# Altium schematic symbol library SCHLIB.SchLib: 2608 symbols (part 9 of 20)
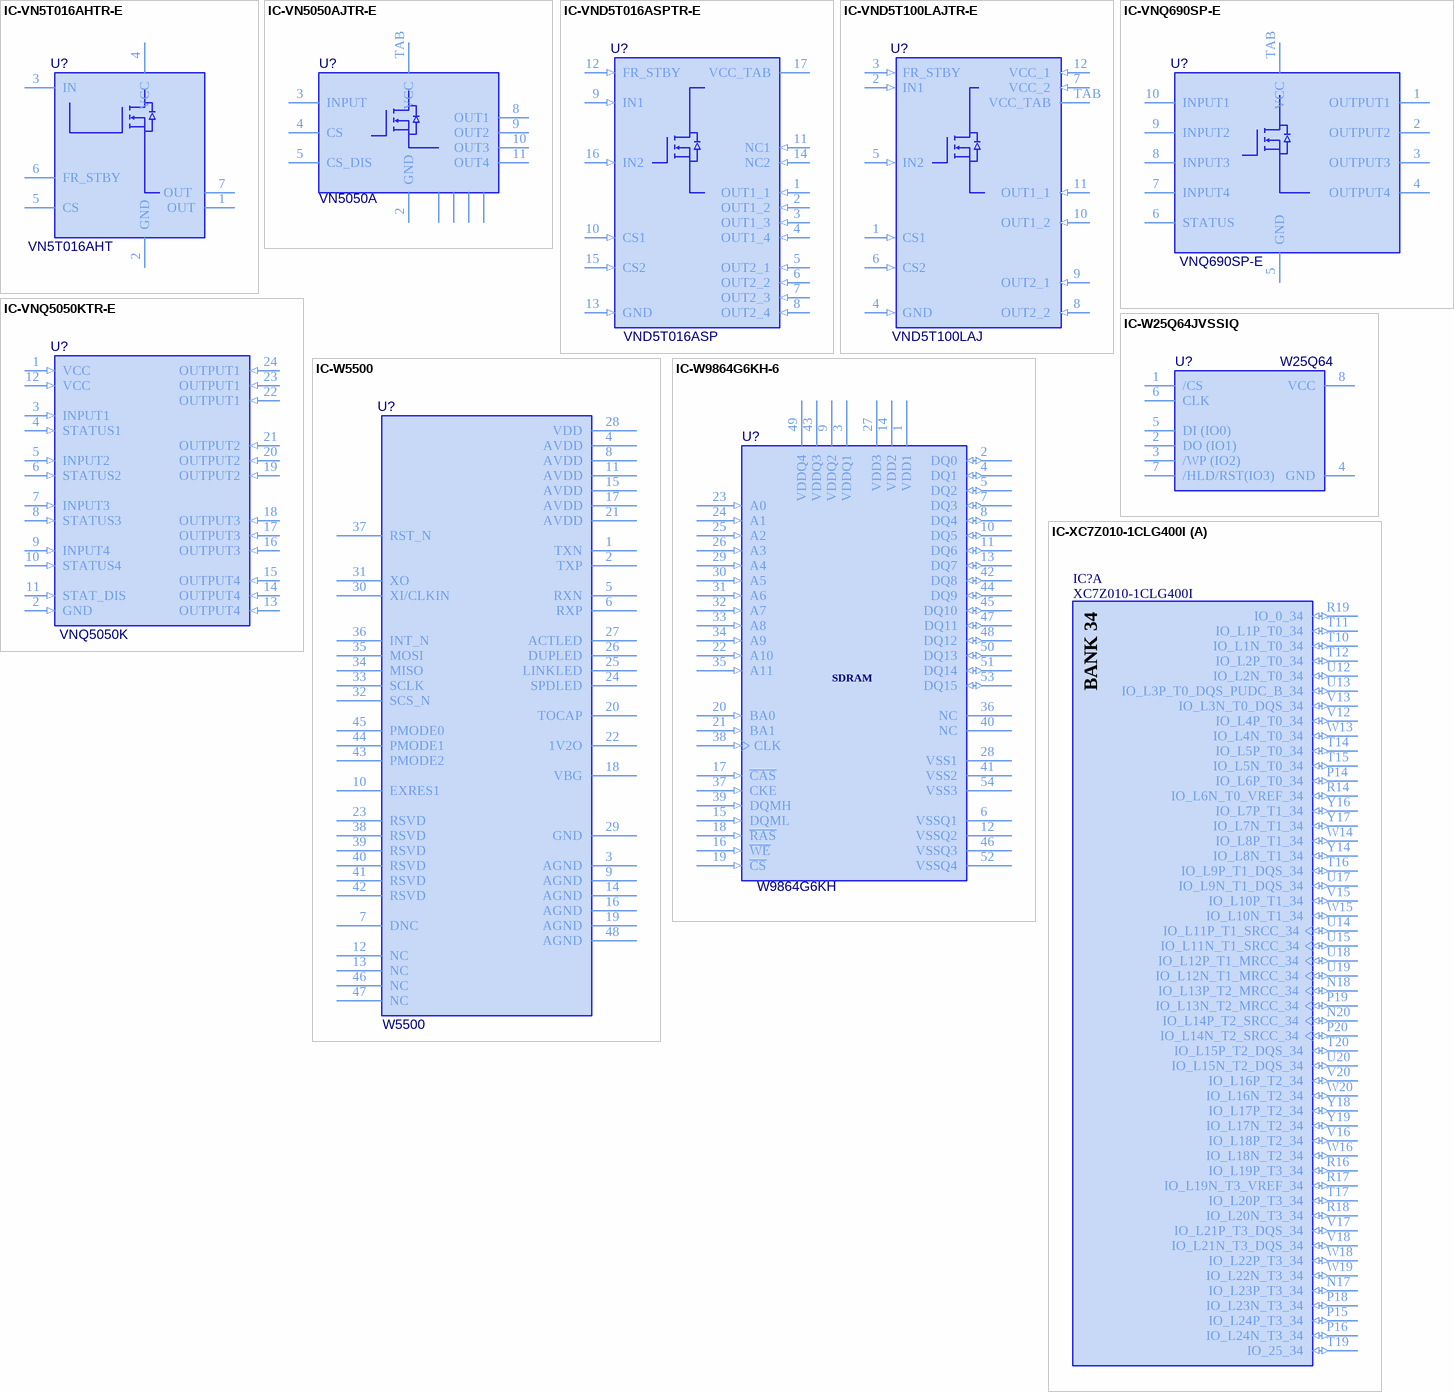
[diagram p91: symbols IC-VN5T016AHTR-E to IC-XC7Z010-1CLG400I]

## IC-VN5050AJTR-E
designator U?, comment VN5050A
IC DVR 1CH HISID AUTO POWERSSO12; Manufacturer: STMicroelectronics; Manufacturer Part Number: VN5050AJTR-E; Max Output Current: 18A; Max Supply Voltage: 36V; Min Supply Voltage: 4.5V; Operating Supply Voltage: 13V; Number of Outputs: 1; Nominal Supply Current: 1.5mA; Turn-Off Delay Time: 40000ns; Turn-On Delay Time: 20000ns; On-State Resistance: 50mR; Output Current per Channel: 12A; Max Supply Current: 3mA; Washability: OK; Supplier 1: Digi-Key; Stock 1: 5770; Pricing 1: 1=2.10000, 10=1.88600, 100=1.51580, 500=1.24534, 1000=1.03186 (USD); RoHS: Yes; Mount: Surface Mount; Number of Pins: 12; Min Operating Temperature: -40°C; Max Operating Temperature: 150°C; Packaging: Tape and Reel; Package Quantity: 2500; Number of Drivers: 1; Radiation Hardening: No; Lead Free: Lead Free; ComponentLink1URL: https://datasheet.ciiva.com/4897/cd00151378-114292-4897872.pdf?src-supplier=Mouser; ComponentLink1Description: https://datasheet.ciiva.com/4897/cd00151378-114292-4897872.pdf?src-supplier=Mouser; ComponentLink2URL: https://datasheet.ciiva.com/41458/001184559-da-01-en-ic-dvr-1ch-vn5050ajtr-e-powersso-12-stm-41458244.pdf?src-supplier=Conrad; ComponentLink2Description: https://datasheet.ciiva.com/41458/001184559-da-01-en-ic-dvr-1ch-vn5050ajtr-e-powersso-12-stm-41458244.pdf?src-supplier=Conrad; ComponentLink3URL: https://datasheet.ciiva.com/1955/cd00151378-1955224.pdf?src-supplier=Digi-Key; ComponentLink3Description: https://datasheet.ciiva.com/1955/cd00151378-1955224.pdf?src-supplier=Digi-Key; ComponentLink4URL: https://datasheet.ciiva.com/1955/cd00151378-1955225.pdf?src-supplier=Digi-Key; ComponentLink4Description: https://datasheet.ciiva.com/1955/cd00151378-1955225.pdf?src-supplier=Digi-Key; ComponentLink5URL: https://datasheet.ciiva.com/1955/cd00151378-1955226.pdf?src-supplier=Digi-Key; ComponentLink5Description: https://datasheet.ciiva.com/1955/cd00151378-1955226.pdf?src-supplier=Digi-Key; ComponentLink6URL: https://datasheet.ciiva.com/26810/getdatasheetpartid-365874-26810746.pdf?src-supplier=Verical; ComponentLink6Description: https://datasheet.ciiva.com/26810/getdatasheetpartid-365874-26810746.pdf?src-supplier=Verical; Supplier Part Number 1: 497-11676-1-ND
footprint PowerSSO-12_M (SOP, 10-Leads, Body 7.5x9.4mm, Pitch 1.27mm, Thermal Pad, IPC Low Density)
pins: 1 NC1, 2 GND, 3 INPUT, 4 CS, 5 CS_DIS, 6 NC2, 7 NC3, 8 OUT1, 9 OUT2, 10 OUT3, 11 OUT4, 12 NC4, TAB VCC

## IC-VND5T016ASPTR-E
designator U?, comment VND5T016ASP
IC PWR DRIVER N-CHAN 1:1 PWRSO16; Manufacturer: STMicroelectronics; Manufacturer Part Number: VND5T016ASPTR-E; Min Supply Voltage: 8V; Number of Outputs: 2; Fault Protection: Over Voltage,Over Temperature; Operating Supply Voltage: 24V; Operating Supply Current: 4.5mA; Turn-Off Delay Time: 45us; Turn-On Delay Time: 50us; Interface: On/Off; Max Supply Current: 6.5mA; Output Configuration: High Side; Max Output Current: 45A; Max Supply Voltage: 36V; Supplier 1: Digi-Key; Supplier Part Number 1: 497-13079-1-ND; Stock: 591; Pricing: 1=5.29, 10=4.748, 25=4.4888, 100=3.6908, 250=3.3117 (USD); RoHS: Yes; Mount: Surface Mount; Number of Pins: 16; Min Operating Temperature: -40°C; Max Operating Temperature: 150°C; Packaging: Tape and Reel; Package Quantity: 600; Number of Drivers: 2; Lead Free: Lead Free; ComponentLink1URL: https://datasheet.ciiva.com/16510/vnd5t016asp-e-16510851.pdf?src-supplier=Future+Electronics; ComponentLink1Description: https://datasheet.ciiva.com/16510/vnd5t016asp-e-16510851.pdf?src-supplier=Future+Electronics; ComponentLink2URL: https://datasheet.ciiva.com/12073/dm00046672-101255-12073525.pdf?src-supplier=Mouser; ComponentLink2Description: https://datasheet.ciiva.com/12073/dm00046672-101255-12073525.pdf?src-supplier=Mouser; ComponentLink3URL: https://datasheet.ciiva.com/41458/001184796-da-01-en-ic-driver-vnd5t016asptr-e-powerso-16-stm-41458154.pdf?src-supplier=Conrad; ComponentLink3Description: https://datasheet.ciiva.com/41458/001184796-da-01-en-ic-driver-vnd5t016asptr-e-powerso-16-stm-41458154.pdf?src-supplier=Conrad; ComponentLink4URL: https://datasheet.ciiva.com/6603/dm00046672-6603110.pdf?src-supplier=Digi-Key; ComponentLink4Description: https://datasheet.ciiva.com/6603/dm00046672-6603110.pdf?src-supplier=Digi-Key; ComponentLink5URL: https://datasheet.ciiva.com/6603/dm00046672-6603111.pdf?src-supplier=Digi-Key; ComponentLink5Description: https://datasheet.ciiva.com/6603/dm00046672-6603111.pdf?src-supplier=Digi-Key; ComponentLink6URL: https://datasheet.ciiva.com/6603/dm00046672-6603112.pdf?src-supplier=Digi-Key; ComponentLink6Description: https://datasheet.ciiva.com/6603/dm00046672-6603112.pdf?src-supplier=Digi-Key
footprint POWERSO16 (SOP, 16-Leads, Body 7.50x9.45mm, Pitch 0.80mm, Thermal Pad 9.60x7.50mm, IPC Medium Density)
pins: 1 OUT1_1 (in), 2 OUT1_2 (in), 3 OUT1_3 (in), 4 OUT1_4 (in), 5 OUT2_1 (in), 6 OUT2_2 (in), 7 OUT2_3 (in), 8 OUT2_4 (in), 9 IN1 (in), 10 CS1 (in), 11 NC1 (in), 12 FR_STBY (in), 13 GND (in), 14 NC2 (in), 15 CS2 (in), 16 IN2 (in), 17 VCC_TAB

## IC-VND5T100LAJTR-E
designator U?, comment VND5T100LAJ
IC PWR DRVR N-CHAN 1:1 PWRSSO12; Manufacturer: STMicroelectronics; Manufacturer Part Number: VND5T100LAJTR-E; Fault Protection: Over Temperature; Number of Outputs: 2; Max Supply Voltage: 36V; Min Supply Voltage: 8V; Interface: On/Off; Max Output Current: 16A; Turn-On Delay Time: 27000ns; Turn-Off Delay Time: 38000ns; Max Supply Current: 6mA; Output Configuration: High Side; Supplier 1: Digi-Key; Supplier Part Number 1: 497-14314-1-ND; Stock: 4669; Pricing: 1=2.65, 10=2.38, 25=2.25, 100=1.85, 250=1.66, 500=1.6, 1000=1.33 (USD); RoHS: Yes; Mount: Surface Mount; Number of Pins: 12; Min Operating Temperature: -40°C; Max Operating Temperature: 150°C; Packaging: Tape and Reel; Package Quantity: 2500; Number of Drivers: 2; Radiation Hardening: No; ComponentLink1URL: https://datasheet.ciiva.com/29600/dm00058385-29600064.pdf?src-supplier=Digi-Key; ComponentLink1Description: https://datasheet.ciiva.com/29600/dm00058385-29600064.pdf?src-supplier=Digi-Key
footprint PowerSSO-12_M (SOP, 10-Leads, Body 7.5x9.4mm, Pitch 1.27mm, Thermal Pad, IPC Low Density)
pins: 1 CS1 (in), 2 IN1 (in), 3 FR_STBY (in), 4 GND (in), 5 IN2 (in), 6 CS2 (in), 7 VCC_2 (in), 8 OUT2_2 (in), 9 OUT2_1 (in), 10 OUT1_2 (in), 11 OUT1_1 (in), 12 VCC_1 (in), TAB VCC_TAB

## IC-VNQ690SP-E
designator U?, comment VNQ690SP-E
IC DVR QUAD HIGH SIDE POWERSO10; Manufacturer: STMicroelectronics; Max Output Current: 10A; On-State Resistance: 90mR; Output Current per Channel: 6A; Max Supply Current: 6mA; Power Dissipation: 78W; Number of Outputs: 4; Max Input Voltage: 36V; Min Input Voltage: 5.5V; Supplier 1: Digi-Key; Supplier Part Number 1: 497-19257-ND; Manufacturer Part Number: VNQ690SP-E; Stock: 377; Pricing: 1=4.28, 10=3.846, 25=3.636, 100=2.9896, 250=2.6826, 500=2.5856, 1000=2.1493, 2500=2.0685, 5000=2.0038 (USD); RoHS: Yes; Mount: Surface Mount; Number of Pins: 10; Min Operating Temperature: -40°C; Max Operating Temperature: 150°C; Output Current: 10A; Nominal Supply Current: 6mA; Packaging: Rail/Tube; Package Quantity: 50; Max Power Dissipation: 78W; Operating Supply Voltage: 36V; Radiation Hardening: No; ComponentLink1URL: https://datasheet.ciiva.com/1957/cd00044338-1957014.pdf?src-supplier=Digi-Key; ComponentLink1Description: https://datasheet.ciiva.com/1957/cd00044338-1957014.pdf?src-supplier=Digi-Key; ComponentLink2URL: https://datasheet.ciiva.com/12186/cd00044338-470173-12186541.pdf?src-supplier=Mouser; ComponentLink2Description: https://datasheet.ciiva.com/12186/cd00044338-470173-12186541.pdf?src-supplier=Mouser
pins: 1 OUTPUT1, 2 OUTPUT2, 3 OUTPUT3, 4 OUTPUT4, 5 GND, 6 STATUS, 7 INPUT4, 8 INPUT3, 9 INPUT2, 10 INPUT1, TAB VCC

## IC-VNQ5050KTR-E
designator U?, comment VNQ5050K
IC DRIVER HISIDE QUAD POWERSSO24; Manufacturer: STMicroelectronics; Manufacturer Part Number: VNQ5050KTR-E; Interface: On/Off; Number of Drivers: 4; Turn-Off Delay Time: 40000ns; Turn-On Delay Time: 15000ns; Max Supply Current: 14mA; Output Configuration: High Side; Max Output Current: 12A; Max Supply Voltage: 36V; Min Supply Voltage: 4.5V; Operating Supply Voltage: 13V; Fault Protection: Over Voltage,Over Temperature; Supplier 1: Digi-Key; Supplier Part Number 1: 497-11716-1-ND; Stock: 15624; Pricing: 1=4.5, 10=4.042, 25=3.8216, 100=3.1422, 250=2.8195, 500=2.7176 (USD); RoHS: Yes; Mount: Surface Mount; Number of Pins: 24; Min Operating Temperature: -40°C; Max Operating Temperature: 150°C; Packaging: Tape and Reel; Number of Outputs: 4; Output Current: 12A; Nominal Supply Current: 14mA; Package Quantity: 1000; Radiation Hardening: No; Lead Free: Lead Free; ComponentLink1URL: https://datasheet.ciiva.com/15109/getdatasheetpartid-98655-15109902.pdf?src-supplier=Verical; ComponentLink1Description: https://datasheet.ciiva.com/15109/getdatasheetpartid-98655-15109902.pdf?src-supplier=Verical; ComponentLink2URL: https://datasheet.ciiva.com/1955/cd00044249-1955296.pdf?src-supplier=Digi-Key; ComponentLink2Description: https://datasheet.ciiva.com/1955/cd00044249-1955296.pdf?src-supplier=Digi-Key; ComponentLink3URL: https://datasheet.ciiva.com/1955/cd00044249-1955297.pdf?src-supplier=Digi-Key; ComponentLink3Description: https://datasheet.ciiva.com/1955/cd00044249-1955297.pdf?src-supplier=Digi-Key; ComponentLink4URL: https://datasheet.ciiva.com/1955/cd00044249-1955298.pdf?src-supplier=Digi-Key; ComponentLink4Description: https://datasheet.ciiva.com/1955/cd00044249-1955298.pdf?src-supplier=Digi-Key; ComponentLink5URL: https://datasheet.ciiva.com/48511/cd00044249-48511581.pdf?src-supplier=Avnet; ComponentLink5Description: https://datasheet.ciiva.com/48511/cd00044249-48511581.pdf?src-supplier=Avnet; ComponentLink6URL: https://datasheet.ciiva.com/17236/cd00044249-17236447.pdf?src-supplier=Avnet+Europe; ComponentLink6Description: https://datasheet.ciiva.com/17236/cd00044249-17236447.pdf?src-supplier=Avnet+Europe
footprint POWERSSO24 (SOP, 24-Leads, Body 10.30x7.50mm, Pitch 0.80mm, Thermal Pad 7.10x4.70mm, IPC Medium Density)
pins: 1 VCC (in), 2 GND (in), 3 INPUT1 (in), 4 STATUS1 (in), 5 INPUT2 (in), 6 STATUS2 (in), 7 INPUT3 (in), 8 STATUS3 (in), 9 INPUT4 (in), 10 STATUS4 (in), 11 STAT_DIS (in), 12 VCC (in), 13 OUTPUT4 (in), 14 OUTPUT4 (in), 15 OUTPUT4 (in), 16 OUTPUT3 (in), 17 OUTPUT3 (in), 18 OUTPUT3 (in), 19 OUTPUT2 (in), 20 OUTPUT2 (in), 21 OUTPUT2 (in), 22 OUTPUT1 (in), 23 OUTPUT1 (in), 24 OUTPUT1 (in)

## IC-W25Q64JVSSIQ
designator U?, comment W25Q64
IC FLASH 64M SPI 133MHZ 8SOIC; Manufacturer: Winbond; Manufacturer Part Number: W25Q64JVSSIQ; Frequency: 104MHz; Max Supply Voltage: 3.6V; Min Supply Voltage: 2.7V; Page Size: 256B; Density: 64MB; Operating Supply Voltage: 3V; Address Bus Width: 24b; Access Time: 6ns; Washability: OK; Supplier 1: Digi-Key; Stock 1: 94868; Pricing 1: 1=0.93000, 10=0.84500, 25=0.83400, 90=0.82933, 180=0.74156, 270=0.73515, 540=0.72443, 1080=0.69830, 5040=0.63617 (USD); RoHS: Yes; Mount: Surface Mount; Case/Package: SOIC; Number of Pins: 8; Min Operating Temperature: -40°C; Max Operating Temperature: 85°C; Packaging: Tray; Memory Type: FLASH; Interface: SPI; ComponentLink1URL: http://www.winbond.com/resource-files/w25q64jv%20revj%2003272018%20plus.pdf?src-supplier=Digi-Key; ComponentLink1Description: http://www.winbond.com/resource-files/w25q64jv%20revj%2003272018%20plus.pdf?src-supplier=Digi-Key; ComponentLink2URL: https://www.winbond.com/resource-files/w25q64jv%20spi%20%20%20revc%2006032016%20kms.pdf?src-supplier=Avnet+Asia; ComponentLink2Description: https://www.winbond.com/resource-files/w25q64jv%20spi%20%20%20revc%2006032016%20kms.pdf?src-supplier=Avnet+Asia; Supplier Part Number 1: W25Q64JVSSIQ-ND
footprint SOIC8-IPC (SOIC, 8-Leads, Body 5.28x5.28mm, Pitch 1.27mm, IPC Medium Density)
pins: 1 /CS, 2 DO (IO1), 3 /WP (IO2), 4 GND, 5 DI (IO0), 6 CLK, 7 /HLD/RST(IO3), 8 VCC

## IC-W5500
designator U?, comment W5500
IC CTLR 3-1 ETH TCP/IP 48LQFP; Manufacturer: WIZnet; Max Supply Current: 132mA; Max Supply Voltage: 3.63V; Min Supply Voltage: 2.97V; Interface: SPI; Number of Transceivers: 1; Washability: OK; Supplier 1: Digi-Key; Supplier Part Number 1: 1278-1021-ND; Manufacturer Part Number: W5500; Stock 1: 17704; Pricing 1: 1=3.95000, 10=3.54600, 25=3.35240, 100=2.75650, 250=2.47340, 500=2.38400, 1000=1.98170, 2500=1.90720, 5000=1.84760 (USD); RoHS: Yes; Case/Package: LQFP; Number of Pins: 48; Min Operating Temperature: -40°C; Max Operating Temperature: 85°C; Packaging: Tray; Package Quantity: 250; Operating Supply Current: 132mA; Lead Free: Lead Free; ComponentLink1URL: https://datasheet.ciiva.com/29644/w5500-ds-v100e-29644866.pdf?src-supplier=Digi-Key; ComponentLink1Description: https://datasheet.ciiva.com/29644/w5500-ds-v100e-29644866.pdf?src-supplier=Digi-Key; ComponentLink2URL: https://datasheet.ciiva.com/24199/w5500-24199988.pdf?src-supplier=Future+Electronics; ComponentLink2Description: https://datasheet.ciiva.com/24199/w5500-24199988.pdf?src-supplier=Future+Electronics
footprint STM-LQFP48_M (QFP, 48-Leads, Body 7x7mm, Pitch 0.5mm, IPC Low Density)
pins: 1 TXN, 2 TXP, 3 AGND, 4 AVDD, 5 RXN, 6 RXP, 7 DNC, 8 AVDD, 9 AGND, 10 EXRES1, 11 AVDD, 12 NC, 13 NC, 14 AGND, 15 AVDD, 16 AGND, 17 AVDD, 18 VBG, 19 AGND, 20 TOCAP, 21 AVDD, 22 1V2O, 23 RSVD, 24 SPDLED, 25 LINKLED, 26 DUPLED, 27 ACTLED, 28 VDD, 29 GND, 30 XI/CLKIN, 31 XO, 32 SCS_N, 33 SCLK, 34 MISO, 35 MOSI, 36 INT_N, 37 RST_N, 38 RSVD, 39 RSVD, 40 RSVD, 41 RSVD, 42 RSVD, 43 PMODE2, 44 PMODE1, 45 PMODE0, 46 NC, 47 NC, 48 AGND

## IC-W9864G6KH-6
designator U?, comment W9864G6KH
IC SDRAM 64MBIT 166MHZ 54TSOP; Manufacturer: Winbond; Manufacturer Part Number: W9864G6KH-6; Interface: Parallel; Memory Type: RAM; Washability: OK; Supplier 1: Digi-Key; Stock 1: 1100; Pricing 1: 1=1.21000, 10=1.10500, 25=1.07560, 50=1.07000, 108=0.95648, 324=0.95361, 540=0.93943, 1080=0.89913, 5076=0.83725 (USD); RoHS: Yes; Case/Package: TSOP; Min Operating Temperature: 0°C; Max Operating Temperature: 70°C; Packaging: Tray; Frequency: 166MHz; ComponentLink1URL: http://www.winbond.com/resource-files/w9864g6kh_a02.pdf?src-supplier=Digi-Key; ComponentLink1Description: http://www.winbond.com/resource-files/w9864g6kh_a02.pdf?src-supplier=Digi-Key; Supplier Part Number 1: W9864G6KH-6-ND
footprint TSOP-54 II (TSOP, 54-Leads, Body 22.22x10.16mm, Pitch 0.80mm, IPC Medium Density)
pins: 1 VDD1 (power), 2 DQ0 (io), 3 VDDQ1 (power), 4 DQ1 (io), 5 DQ2 (io), 6 VSSQ1 (power), 7 DQ3 (io), 8 DQ4 (io), 9 VDDQ2 (power), 10 DQ5 (io), 11 DQ6 (io), 12 VSSQ2 (power), 13 DQ7 (io), 14 VDD2 (power), 15 DQML (in), 16 ~{WE} (in), 17 ~{CAS} (in), 18 ~{RAS} (in), 19 ~{CS} (in), 20 BA0 (in), 21 BA1 (in), 22 A10 (in), 23 A0 (in), 24 A1 (in), 25 A2 (in), 26 A3 (in), 27 VDD3 (power), 28 VSS1 (power), 29 A4 (in), 30 A5 (in), 31 A6 (in), 32 A7 (in), 33 A8 (in), 34 A9 (in), 35 A11 (in), 36 NC, 37 CKE (in), 38 CLK (in), 39 DQMH (in), 40 NC, 41 VSS2 (power), 42 DQ8 (io), 43 VDDQ3 (power), 44 DQ9 (io), 45 DQ10 (io), 46 VSSQ3 (power), 47 DQ11 (io), 48 DQ12 (io), 49 VDDQ4 (power), 50 DQ13 (io), 51 DQ14 (io), 52 VSSQ4 (power), 53 DQ15 (io), 54 VSS3 (power)
text: SDRAM

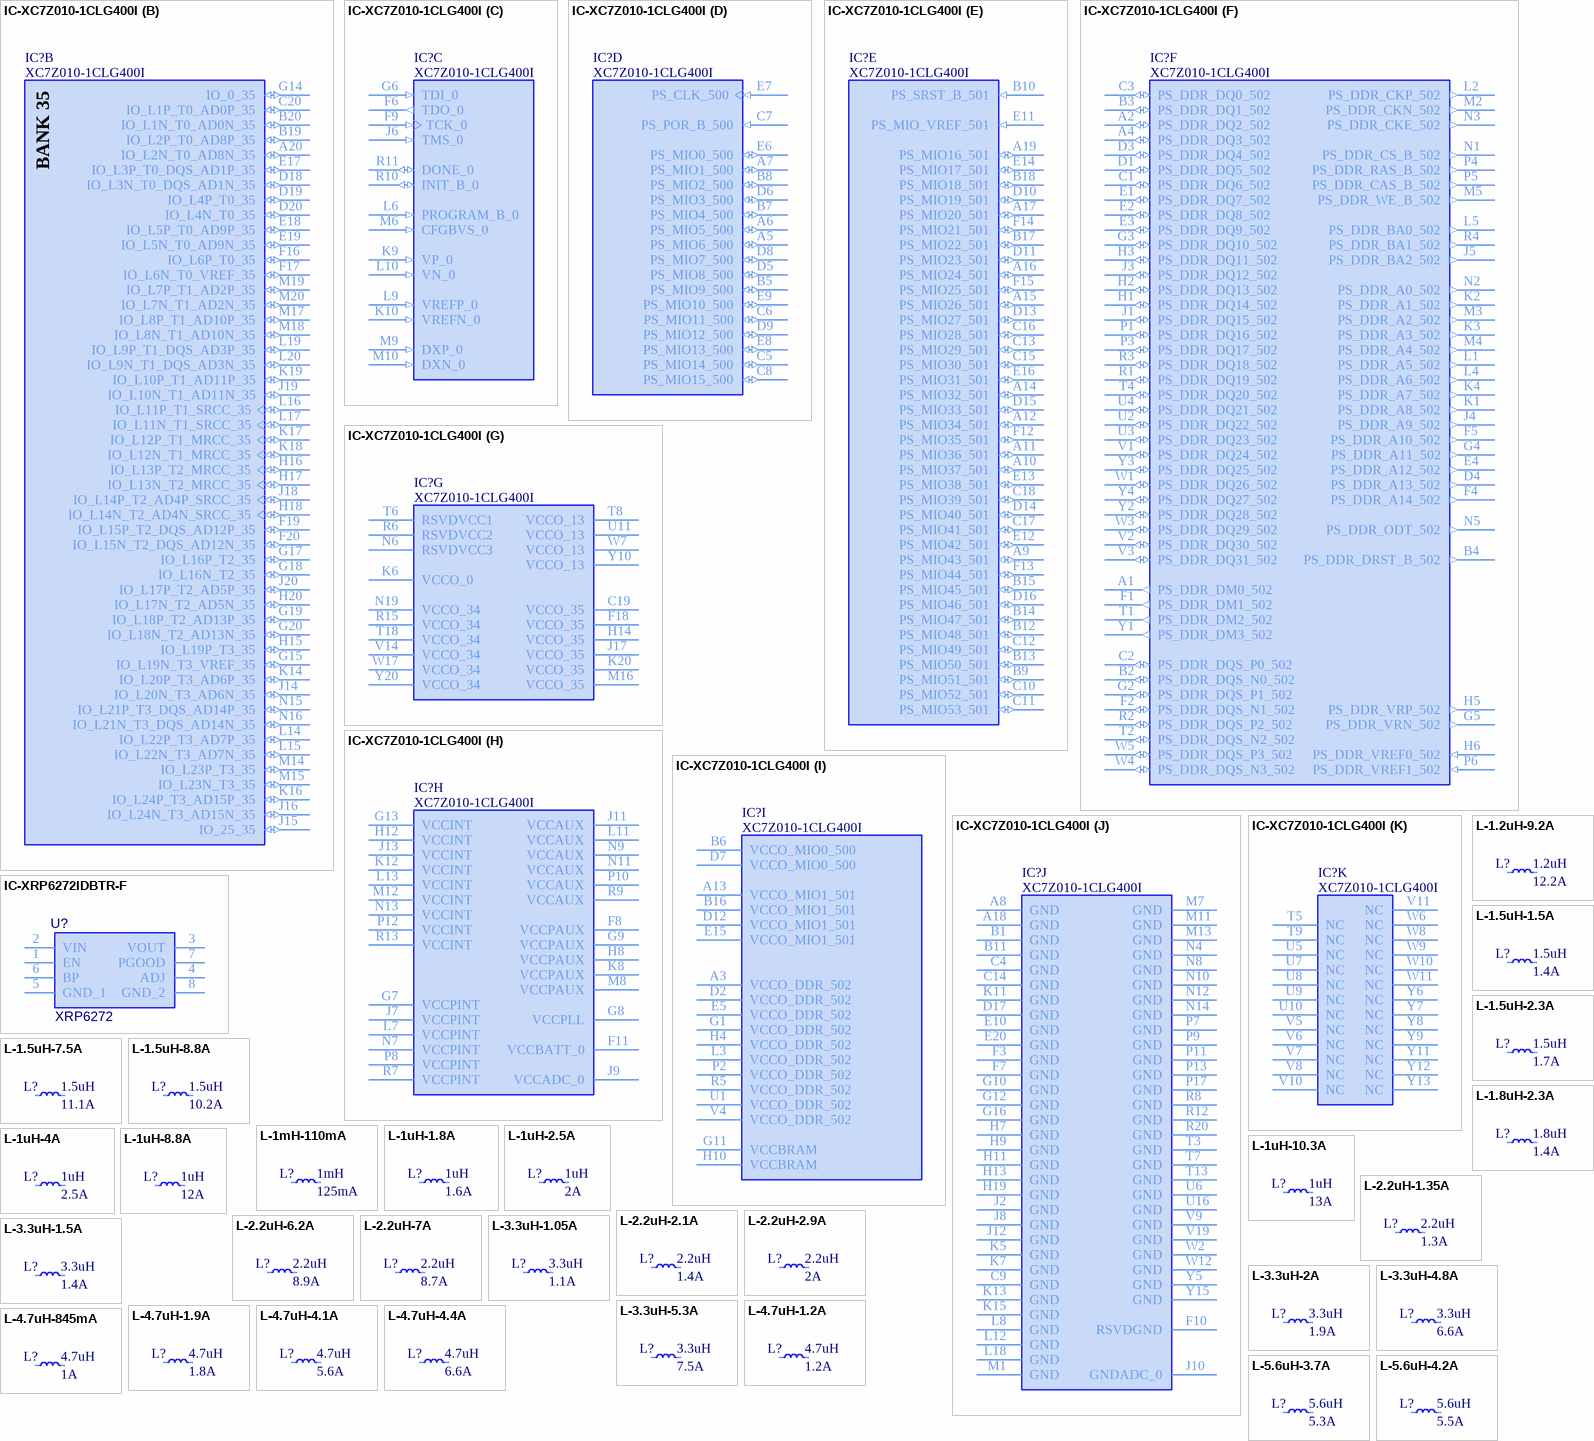
[diagram p38: symbols IC-XC7Z010-1CLG400I to L-5.6uH-4.2A]

## IC-XC7Z010-1CLG400I
designator IC?, comment XC7Z010-1CLG400I
667 MHz Zynq™-7000 AP SoC, 130 PS I/O, 100 FPGA I/O, 400-Ball BGA, Speed Grade 1, Industrial Grade, Pb-Free; Manufacturer: XILINX; PressFit: No; Bonding: No; Component Kind: Standard; Component Type: Standard; Device: XC7Z010-1CLG400I; Footprint: BGA400C80P20X20_1700X1700X160; PackageDescription: BGA, 0.80mm Pitch, Square; 400 Pin, 20 Columns X 20 Rows, Body 17.00mm X 17.00mm X 1.60mm H, IPC Medium Density; Part Description: 667 MHz Zynq™-7000 AP SoC, 130 PS I/O, 100 FPGA I/O, 400-Ball BGA, Speed Grade 1, Industrial Grade, Pb-Free; Manufacturer Part Number: XC7Z010-1CLG400I; Pin Count: 400; Case: BGA400; Mounted: Yes; Socket: No; SMD: Yes; Sense: No; ComponentHeight: 1.6mm; ComponentLink1URL: \\cern.ch\dfs\Applications\Altium\Datasheets\XC7Z010-1CLG400I_Package-Pinout.pdf; ComponentLink1Description: Package/Pinout
footprint BGA400C80P20X20_1700X1700X160
part A pins: N17 IO_L23P_T3_34 (io), N18 IO_L13P_T2_MRCC_34 (io), N20 IO_L14P_T2_SRCC_34 (io), P14 IO_L6P_T0_34 (io), P15 IO_L24P_T3_34 (io), P16 IO_L24N_T3_34 (io), P18 IO_L23N_T3_34 (io), P19 IO_L13N_T2_MRCC_34 (io), P20 IO_L14N_T2_SRCC_34 (io), R14 IO_L6N_T0_VREF_34 (io), R16 IO_L19P_T3_34 (io), R17 IO_L19N_T3_VREF_34 (io), R18 IO_L20N_T3_34 (io), R19 IO_0_34 (io), T10 IO_L1N_T0_34 (io), T11 IO_L1P_T0_34 (io), T12 IO_L2P_T0_34 (io), T14 IO_L5P_T0_34 (io), T15 IO_L5N_T0_34 (io), T16 IO_L9P_T1_DQS_34 (io), T17 IO_L20P_T3_34 (io), T19 IO_25_34 (io), T20 IO_L15P_T2_DQS_34 (io), U12 IO_L2N_T0_34 (io), U13 IO_L3P_T0_DQS_PUDC_B_34 (io), U14 IO_L11P_T1_SRCC_34 (io), U15 IO_L11N_T1_SRCC_34 (io), U17 IO_L9N_T1_DQS_34 (io), U18 IO_L12P_T1_MRCC_34 (io), U19 IO_L12N_T1_MRCC_34 (io), U20 IO_L15N_T2_DQS_34 (io), V12 IO_L4P_T0_34 (io), V13 IO_L3N_T0_DQS_34 (io), V15 IO_L10P_T1_34 (io), V16 IO_L18P_T2_34 (io), V17 IO_L21P_T3_DQS_34 (io), V18 IO_L21N_T3_DQS_34 (io), V20 IO_L16P_T2_34 (io), W13 IO_L4N_T0_34 (io), W14 IO_L8P_T1_34 (io), W15 IO_L10N_T1_34 (io), W16 IO_L18N_T2_34 (io), W18 IO_L22P_T3_34 (io), W19 IO_L22N_T3_34 (io), W20 IO_L16N_T2_34 (io), Y14 IO_L8N_T1_34 (io), Y16 IO_L7P_T1_34 (io), Y17 IO_L7N_T1_34 (io), Y18 IO_L17P_T2_34 (io), Y19 IO_L17N_T2_34 (io)
part B pins: A20 IO_L2N_T0_AD8N_35 (io), B19 IO_L2P_T0_AD8P_35 (io), B20 IO_L1N_T0_AD0N_35 (io), C20 IO_L1P_T0_AD0P_35 (io), D18 IO_L3N_T0_DQS_AD1N_35 (io), D19 IO_L4P_T0_35 (io), D20 IO_L4N_T0_35 (io), E17 IO_L3P_T0_DQS_AD1P_35 (io), E18 IO_L5P_T0_AD9P_35 (io), E19 IO_L5N_T0_AD9N_35 (io), F16 IO_L6P_T0_35 (io), F17 IO_L6N_T0_VREF_35 (io), F19 IO_L15P_T2_DQS_AD12P_35 (io), F20 IO_L15N_T2_DQS_AD12N_35 (io), G14 IO_0_35 (io), G15 IO_L19N_T3_VREF_35 (io), G17 IO_L16P_T2_35 (io), G18 IO_L16N_T2_35 (io), G19 IO_L18P_T2_AD13P_35 (io), G20 IO_L18N_T2_AD13N_35 (io), H15 IO_L19P_T3_35 (io), H16 IO_L13P_T2_MRCC_35 (io), H17 IO_L13N_T2_MRCC_35 (io), H18 IO_L14N_T2_AD4N_SRCC_35 (io), H20 IO_L17N_T2_AD5N_35 (io), J14 IO_L20N_T3_AD6N_35 (io), J15 IO_25_35 (io), J16 IO_L24N_T3_AD15N_35 (io), J18 IO_L14P_T2_AD4P_SRCC_35 (io), J19 IO_L10N_T1_AD11N_35 (io), J20 IO_L17P_T2_AD5P_35 (io), K14 IO_L20P_T3_AD6P_35 (io), K16 IO_L24P_T3_AD15P_35 (io), K17 IO_L12P_T1_MRCC_35 (io), K18 IO_L12N_T1_MRCC_35 (io), K19 IO_L10P_T1_AD11P_35 (io), L14 IO_L22P_T3_AD7P_35 (io), L15 IO_L22N_T3_AD7N_35 (io), L16 IO_L11P_T1_SRCC_35 (io), L17 IO_L11N_T1_SRCC_35 (io), L19 IO_L9P_T1_DQS_AD3P_35 (io), L20 IO_L9N_T1_DQS_AD3N_35 (io), M14 IO_L23P_T3_35 (io), M15 IO_L23N_T3_35 (io), M17 IO_L8P_T1_AD10P_35 (io), M18 IO_L8N_T1_AD10N_35 (io), M19 IO_L7P_T1_AD2P_35 (io), M20 IO_L7N_T1_AD2N_35 (io), N15 IO_L21P_T3_DQS_AD14P_35 (io), N16 IO_L21N_T3_DQS_AD14N_35 (io)
part C pins: F6 TDO_0 (out), F9 TCK_0 (in), G6 TDI_0 (in), J6 TMS_0 (in), K9 VP_0 (in), K10 VREFN_0 (in), L6 PROGRAM_B_0 (in), L9 VREFP_0 (in), L10 VN_0 (in), M6 CFGBVS_0 (in), M9 DXP_0 (in), M10 DXN_0 (in), R10 INIT_B_0 (io), R11 DONE_0 (io)
part D pins: A5 PS_MIO6_500 (io), A6 PS_MIO5_500 (io), A7 PS_MIO1_500 (io), B5 PS_MIO9_500 (io), B7 PS_MIO4_500 (io), B8 PS_MIO2_500 (io), C5 PS_MIO14_500 (io), C6 PS_MIO11_500 (io), C7 PS_POR_B_500 (in), C8 PS_MIO15_500 (io), D5 PS_MIO8_500 (io), D6 PS_MIO3_500 (io), D8 PS_MIO7_500 (io), D9 PS_MIO12_500 (io), E6 PS_MIO0_500 (io), E7 PS_CLK_500 (in), E8 PS_MIO13_500 (io), E9 PS_MIO10_500 (io)
part E pins: A9 PS_MIO43_501 (io), A10 PS_MIO37_501 (io), A11 PS_MIO36_501 (io), A12 PS_MIO34_501 (io), A14 PS_MIO32_501 (io), A15 PS_MIO26_501 (io), A16 PS_MIO24_501 (io), A17 PS_MIO20_501 (io), A19 PS_MIO16_501 (io), B9 PS_MIO51_501 (io), B10 PS_SRST_B_501 (in), B12 PS_MIO48_501 (io), B13 PS_MIO50_501 (io), B14 PS_MIO47_501 (io), B15 PS_MIO45_501 (io), B17 PS_MIO22_501 (io), B18 PS_MIO18_501 (io), C10 PS_MIO52_501 (io), C11 PS_MIO53_501 (io), C12 PS_MIO49_501 (io), C13 PS_MIO29_501 (io), C15 PS_MIO30_501 (io), C16 PS_MIO28_501 (io), C17 PS_MIO41_501 (io), C18 PS_MIO39_501 (io), D10 PS_MIO19_501 (io), D11 PS_MIO23_501 (io), D13 PS_MIO27_501 (io), D14 PS_MIO40_501 (io), D15 PS_MIO33_501 (io), D16 PS_MIO46_501 (io), E11 PS_MIO_VREF_501 (in), E12 PS_MIO42_501 (io), E13 PS_MIO38_501 (io), E14 PS_MIO17_501 (io), E16 PS_MIO31_501 (io), F12 PS_MIO35_501 (io), F13 PS_MIO44_501 (io), F14 PS_MIO21_501 (io), F15 PS_MIO25_501 (io)
part F pins: A1 PS_DDR_DM0_502 (out), A2 PS_DDR_DQ2_502 (io), A4 PS_DDR_DQ3_502 (io), B2 PS_DDR_DQS_N0_502 (io), B3 PS_DDR_DQ1_502 (io), B4 PS_DDR_DRST_B_502 (out), C1 PS_DDR_DQ6_502 (io), C2 PS_DDR_DQS_P0_502 (io), C3 PS_DDR_DQ0_502 (io), D1 PS_DDR_DQ5_502 (io), D3 PS_DDR_DQ4_502 (io), D4 PS_DDR_A13_502 (out), E1 PS_DDR_DQ7_502 (io), E2 PS_DDR_DQ8_502 (io), E3 PS_DDR_DQ9_502 (io), E4 PS_DDR_A12_502 (out), F1 PS_DDR_DM1_502 (out), F2 PS_DDR_DQS_N1_502 (io), F4 PS_DDR_A14_502 (out), F5 PS_DDR_A10_502 (out), G2 PS_DDR_DQS_P1_502 (io), G3 PS_DDR_DQ10_502 (io), G4 PS_DDR_A11_502 (out), G5 PS_DDR_VRN_502 (out), H1 PS_DDR_DQ14_502 (io), H2 PS_DDR_DQ13_502 (io), H3 PS_DDR_DQ11_502 (io), H5 PS_DDR_VRP_502 (out), H6 PS_DDR_VREF0_502 (in), J1 PS_DDR_DQ15_502 (io), J3 PS_DDR_DQ12_502 (io), J4 PS_DDR_A9_502 (out), J5 PS_DDR_BA2_502 (out), K1 PS_DDR_A8_502 (out), K2 PS_DDR_A1_502 (out), K3 PS_DDR_A3_502 (out), K4 PS_DDR_A7_502 (out), L1 PS_DDR_A5_502 (out), L2 PS_DDR_CKP_502 (out), L4 PS_DDR_A6_502 (out), L5 PS_DDR_BA0_502 (out), M2 PS_DDR_CKN_502 (out), M3 PS_DDR_A2_502 (out), M4 PS_DDR_A4_502 (out), M5 PS_DDR_WE_B_502 (out), N1 PS_DDR_CS_B_502 (out), N2 PS_DDR_A0_502 (out), N3 PS_DDR_CKE_502 (out), N5 PS_DDR_ODT_502 (out), P1 PS_DDR_DQ16_502 (io), P3 PS_DDR_DQ17_502 (io), P4 PS_DDR_RAS_B_502 (out), P5 PS_DDR_CAS_B_502 (out), P6 PS_DDR_VREF1_502 (in), R1 PS_DDR_DQ19_502 (io), R2 PS_DDR_DQS_P2_502 (io), R3 PS_DDR_DQ18_502 (io), R4 PS_DDR_BA1_502 (out), T1 PS_DDR_DM2_502 (out), T2 PS_DDR_DQS_N2_502 (io), T4 PS_DDR_DQ20_502 (io), U2 PS_DDR_DQ22_502 (io), U3 PS_DDR_DQ23_502 (io), U4 PS_DDR_DQ21_502 (io), V1 PS_DDR_DQ24_502 (io), V2 PS_DDR_DQ30_502 (io), V3 PS_DDR_DQ31_502 (io), W1 PS_DDR_DQ26_502 (io), W3 PS_DDR_DQ29_502 (io), W4 PS_DDR_DQS_N3_502 (io), W5 PS_DDR_DQS_P3_502 (io), Y1 PS_DDR_DM3_502 (out), Y2 PS_DDR_DQ28_502 (io), Y3 PS_DDR_DQ25_502 (io), Y4 PS_DDR_DQ27_502 (io)
part G pins: C19 VCCO_35 (power), F18 VCCO_35 (power), H14 VCCO_35 (power), J17 VCCO_35 (power), K6 VCCO_0 (power), K20 VCCO_35 (power), M16 VCCO_35 (power), N6 RSVDVCC3 (power), N19 VCCO_34 (power), R6 RSVDVCC2 (power), R15 VCCO_34 (power), T6 RSVDVCC1 (power), T8 VCCO_13 (power), T18 VCCO_34 (power), U11 VCCO_13 (power), V14 VCCO_34 (power), W7 VCCO_13 (power), W17 VCCO_34 (power), Y10 VCCO_13 (power), Y20 VCCO_34 (power)
part H pins: F8 VCCPAUX (power), F11 VCCBATT_0 (power), G7 VCCPINT (power), G8 VCCPLL (power), G9 VCCPAUX (power), G13 VCCINT (power), H8 VCCPAUX (power), H12 VCCINT (power), J7 VCCPINT (power), J9 VCCADC_0 (power), J11 VCCAUX (power), J13 VCCINT (power), K8 VCCPAUX (power), K12 VCCINT (power), L7 VCCPINT (power), L11 VCCAUX (power), L13 VCCINT (power), M8 VCCPAUX (power), M12 VCCINT (power), N7 VCCPINT (power), N9 VCCAUX (power), N11 VCCAUX (power), N13 VCCINT (power), P8 VCCPINT (power), P10 VCCAUX (power), P12 VCCINT (power), R7 VCCPINT (power), R9 VCCAUX (power), R13 VCCINT (power)
part I pins: A3 VCCO_DDR_502 (power), A13 VCCO_MIO1_501 (power), B6 VCCO_MIO0_500 (power), B16 VCCO_MIO1_501 (power), D2 VCCO_DDR_502 (power), D7 VCCO_MIO0_500 (power), D12 VCCO_MIO1_501 (power), E5 VCCO_DDR_502 (power), E15 VCCO_MIO1_501 (power), G1 VCCO_DDR_502 (power), G11 VCCBRAM (power), H4 VCCO_DDR_502 (power), H10 VCCBRAM (power), L3 VCCO_DDR_502 (power), P2 VCCO_DDR_502 (power), R5 VCCO_DDR_502 (power), U1 VCCO_DDR_502 (power), V4 VCCO_DDR_502 (power)
part J pins: A8 GND (power), A18 GND (power), B1 GND (power), B11 GND (power), C4 GND (power), C9 GND (power), C14 GND (power), D17 GND (power), E10 GND (power), E20 GND (power), F3 GND (power), F7 GND (power), F10 RSVDGND (power), G10 GND (power), G12 GND (power), G16 GND (power), H7 GND (power), H9 GND (power), H11 GND (power), H13 GND (power), H19 GND (power), J2 GND (power), J8 GND (power), J10 GNDADC_0 (power), J12 GND (power), K5 GND (power), K7 GND (power), K11 GND (power), K13 GND (power), K15 GND (power), L8 GND (power), L12 GND (power), L18 GND (power), M1 GND (power), M7 GND (power), M11 GND (power), M13 GND (power), N4 GND (power), N8 GND (power), N10 GND (power), N12 GND (power), N14 GND (power), P7 GND (power), P9 GND (power), P11 GND (power), P13 GND (power), P17 GND (power), R8 GND (power), R12 GND (power), R20 GND (power), T3 GND (power), T7 GND (power), T13 GND (power), U6 GND (power), U16 GND (power), V9 GND (power), V19 GND (power), W2 GND (power), W12 GND (power), Y5 GND (power), Y15 GND (power)
part K pins: T5 NC, T9 NC, U5 NC, U7 NC, U8 NC, U9 NC, U10 NC, V5 NC, V6 NC, V7 NC, V8 NC, V10 NC, V11 NC, W6 NC, W8 NC, W9 NC, W10 NC, W11 NC, Y6 NC, Y7 NC, Y8 NC, Y9 NC, Y11 NC, Y12 NC, Y13 NC
part A text: BANK 34
part B text: BANK 35

## IC-XRP6272IDBTR-F
designator U?, comment XRP6272
IC REG LINEAR POS ADJ 2A 8HSOICN; Manufacturer: Exar; Manufacturer Part Number: XRP6272IDBTR-F; Polarity: Positive; Quiescent Current: 30uA; Reference Voltage: 700mV; Accuracy: 2%; Output Type: Adjustable,Fixed; Dropout Voltage: 480mV; Output Voltage: 5V; Number of Outputs: 1; Max Input Voltage: 6V; Min Current Limit: 2.2A; Min Input Voltage: 1.8V; Washability: OK; Supplier 1: Digi-Key; Supplier Part Number 1: 1016-1746-1-ND; Stock 1: 15134; Pricing 1: 1=0.93000, 10=0.83400, 25=0.79200, 100=0.60820, 250=0.53748, 500=0.50918, 1000=0.39603 (USD); RoHS: Yes; Mount: Surface Mount; Case/Package: SOIC; Number of Pins: 8; Min Operating Temperature: -40°C; Max Operating Temperature: 85°C; Package Quantity: 1; Packaging: Tape and Reel; Output Current: 2A; Max Output Current: 2A; Number of Regulators: 1; Min Output Voltage: 700mV; Length: 5mm; Height: 1.5mm; Width: 4mm; Radiation Hardening: No; Lead Free: Lead Free; REACH SVHC: Unknown; ComponentLink1URL: https://datasheet.ciiva.com/4887/xrp6272-188953-4887939.pdf?src-supplier=Mouser; ComponentLink1Description: https://datasheet.ciiva.com/4887/xrp6272-188953-4887939.pdf?src-supplier=Mouser; ComponentLink2URL: https://datasheet.ciiva.com/2040/xrp6272-ds-r120-113011-2040855.pdf?src-supplier=Digi-Key; ComponentLink2Description: https://datasheet.ciiva.com/2040/xrp6272-ds-r120-113011-2040855.pdf?src-supplier=Digi-Key; ComponentLink3URL: https://datasheet.ciiva.com/23784/xrp6272-ds-r120-113011-23784008.pdf?src-supplier=Newark; ComponentLink3Description: https://datasheet.ciiva.com/23784/xrp6272-ds-r120-113011-23784008.pdf?src-supplier=Newark; ComponentLink4URL: https://datasheet.ciiva.com/2040/xrp6272-ds-r120-113011-2040856.pdf?src-supplier=Digi-Key; ComponentLink4Description: https://datasheet.ciiva.com/2040/xrp6272-ds-r120-113011-2040856.pdf?src-supplier=Digi-Key; ComponentLink5URL: https://datasheet.ciiva.com/2040/xrp6272-ds-r120-113011-2040857.pdf?src-supplier=Digi-Key; ComponentLink5Description: https://datasheet.ciiva.com/2040/xrp6272-ds-r120-113011-2040857.pdf?src-supplier=Digi-Key
footprint SOIC8-EP (SOIC, 8-Leads, Body 5x4mm, Pitch 1.27mm, IPC Low Density)
pins: 1 EN, 2 VIN, 3 VOUT, 4 ADJ, 5 GND_1, 6 BP, 7 PGOOD, 8 GND_2

## L-1.2uH-9.2A
designator L?  Inductance: 1.2uH  Current Rating (Amps): 12.2A
FIXED IND 1.2UH 12.2A 9.4MOHM SM; Manufacturer Part Number: XGL4030-122MEC; Manufacturer: COILCRAFT; Tolerance: ±20%; Isat: 9.2A; Shielding: Shielded; Frequency - Self Resonant: 55MHz; Inductance Frequency - Test: 1MHz; Object Type: Part; Design Item ID: L-1.2uH-9.2A; Series: XGL4030; Material - Core: -; DCR: 9.4mOhm; Q @ Freq: -; Ratings: AEC-Q200; Operating Temperature: -40°C~125°C; Features: -; Mounting Type: SurfaceMount; Size: 4.00mmx4.00mm; Height: 3.10mm; Category: Inductor
footprint XGL4030
pins: 1, 2

## L-1.5uH-1.5A
designator L?  Inductance: 1.5uH  Current Rating (Amps): 1.4A
FIXED IND 1.5UH 1.4A 116MOHM SMD; Manufacturer Part Number: XPL2010-152MLC; Manufacturer: COILCRAFT; Tolerance: ±20%; Isat: 1.5A; Shielding: Shielded; Frequency - Self Resonant: 80MHz; Inductance Frequency - Test: 1MHz; Object Type: Part; Design Item ID: L-1.5uH-1.5A; Series: XPL2010; Material - Core: -; DCR: 116mOhm; Q @ Freq: -; Ratings: AEC-Q200; Operating Temperature: -40°C~125°C; Features: -; Mounting Type: SurfaceMount; Size: 2.00mmx1.90mm; Height: 1.00mm; Category: Inductor
footprint XPL2010
pins: 1, 2

## L-1.5uH-2.3A
designator L?  Inductance: 1.5uH  Current Rating (Amps): 1.7A
FIXED IND 1.5UH 1.7A 100MOHM SMD; Manufacturer Part Number: LPS3015-152MRC; Manufacturer: COILCRAFT; Material - Core: Ferrite; Tolerance: ±20%; Isat: 2.3A; Shielding: Shielded; Frequency - Self Resonant: 140MHz; Inductance Frequency - Test: 100kHz; Object Type: Part; Design Item ID: L-1.5uH-2.3A; Series: LPS3015; DCR: 100mOhm; Q @ Freq: -; Ratings: AEC-Q200; Operating Temperature: -40°C~125°C; Features: -; Mounting Type: SurfaceMount; Size: 2.95mmx2.95mm; Height: 1.50mm; Category: Inductor
footprint LPS3015
pins: 1, 2

## L-1.5uH-7.5A
designator L?  Inductance: 1.5uH  Current Rating (Amps): 11.1A
FIXED IND 1.5UH 11.1A 14.3 MOHM; Manufacturer Part Number: XGL4020-152MEC; Manufacturer: COILCRAFT; Tolerance: ±20%; Isat: 7.5A; Shielding: Shielded; Frequency - Self Resonant: 45MHz; Inductance Frequency - Test: 1MHz; Object Type: Part; Design Item ID: L-1.5uH-7.5A; Series: XGL4020; Material - Core: -; DCR: 14.3mOhm; Q @ Freq: -; Ratings: AEC-Q200; Operating Temperature: -40°C~125°C; Features: -; Mounting Type: SurfaceMount; Size: 4.00mmx4.00mm; Height: 2.10mm; Category: Inductor
footprint XGL4020
pins: 1, 2

## L-1.5uH-8.8A
designator L?  Inductance: 1.5uH  Current Rating (Amps): 10.2A
FIXED IND 1.5UH 10.2A 10.5 MOHM; Manufacturer Part Number: XGL4030-152MEC; Manufacturer: COILCRAFT; Tolerance: ±20%; Isat: 8.8A; Shielding: Shielded; Frequency - Self Resonant: 50MHz; Inductance Frequency - Test: 1MHz; Object Type: Part; Design Item ID: L-1.5uH-8.8A; Series: XGL4030; Material - Core: -; DCR: 10.5mOhm; Q @ Freq: -; Ratings: AEC-Q200; Operating Temperature: -40°C~125°C; Features: -; Mounting Type: SurfaceMount; Size: 4.00mmx4.00mm; Height: 3.10mm; Category: Inductor
footprint XGL4030
pins: 1, 2

## L-1.8uH-2.3A
designator L?  Inductance: 1.8uH  Current Rating (Amps): 1.4A
FIXED IND 1.8UH 1.4A 100MOHM SMD; Manufacturer Part Number: LPS3015-182MRC; Manufacturer: COILCRAFT; Material - Core: Ferrite; Tolerance: ±20%; Isat: 2.3A; Shielding: Shielded; Frequency - Self Resonant: 135MHz; Inductance Frequency - Test: 100kHz; Object Type: Part; Design Item ID: L-1.8uH-2.3A; Series: LPS3015; DCR: 100mOhm; Q @ Freq: -; Ratings: AEC-Q200; Operating Temperature: -40°C~125°C; Features: -; Mounting Type: SurfaceMount; Size: 2.95mmx2.95mm; Height: 1.50mm; Category: Inductor
footprint LPS3015
pins: 1, 2

## L-1mH-110mA
designator L?  Inductance: 1mH  Current Rating (Amps): 125mA
FIXED IND 1MH 125MA 18 OHM SMD; Manufacturer Part Number: LPS4018-105MRC; Manufacturer: COILCRAFT; Material - Core: Ferrite; Tolerance: ±20%; Isat: 110mA; Shielding: Shielded; Frequency - Self Resonant: 2.8MHz; Inductance Frequency - Test: 100kHz; Object Type: Part; DCR: 18Ohm; Design Item ID: L-1mH-110mA; Series: LPS4018; Q @ Freq: -; Ratings: AEC-Q200; Operating Temperature: -40°C~125°C; Features: -; Mounting Type: SurfaceMount; Size: 3.90mmx3.90mm; Height: 1.80mm; Category: Inductor
footprint LPS4018
pins: 1, 2

## L-1uH-1.8A
designator L?  Inductance: 1uH  Current Rating (Amps): 1.6A
FIXED IND 1UH 1.6A 89 MOHM SMD; Manufacturer Part Number: XPL2010-102MLC; Manufacturer: COILCRAFT; Tolerance: ±20%; Isat: 1.8A; Shielding: Shielded; DCR: 89mOhm; Frequency - Self Resonant: 117MHz; Inductance Frequency - Test: 1MHz; Object Type: Part; Design Item ID: L-1uH-1.8A; Series: XPL2010; Material - Core: -; Q @ Freq: -; Ratings: AEC-Q200; Operating Temperature: -40°C~125°C; Features: -; Mounting Type: SurfaceMount; Size: 2.00mmx1.90mm; Height: 1.00mm; Category: Inductor
footprint XPL2010
pins: 1, 2

## L-1uH-2.5A
designator L?  Inductance: 1uH  Current Rating (Amps): 2A
FIXED IND 1UH 2A 75 MOHM SMD; Manufacturer Part Number: LPS3015-102MRC; Manufacturer: COILCRAFT; Material - Core: Ferrite; Tolerance: ±20%; Isat: 2.5A; Shielding: Shielded; DCR: 75mOhm; Frequency - Self Resonant: 190MHz; Inductance Frequency - Test: 100kHz; Object Type: Part; Design Item ID: L-1uH-2.5A; Series: LPS3015; Q @ Freq: -; Ratings: AEC-Q200; Operating Temperature: -40°C~125°C; Features: -; Mounting Type: SurfaceMount; Size: 2.95mmx2.95mm; Height: 1.50mm; Category: Inductor
footprint LPS3015
pins: 1, 2

## L-1uH-4A
designator L?  Inductance: 1uH  Current Rating (Amps): 2.5A
FIXED IND 1UH 2.5A 42 MOHM SMD; Manufacturer Part Number: LPS4018-102NRC; Manufacturer: COILCRAFT; Material - Core: Ferrite; Tolerance: ±30%; Isat: 4A; Shielding: Shielded; DCR: 42mOhm; Frequency - Self Resonant: 180MHz; Inductance Frequency - Test: 100kHz; Object Type: Part; Design Item ID: L-1uH-4A; Series: LPS4018; Q @ Freq: -; Ratings: AEC-Q200; Operating Temperature: -40°C~125°C; Features: -; Mounting Type: SurfaceMount; Size: 3.90mmx3.90mm; Height: 1.80mm; Category: Inductor
footprint LPS4018
pins: 1, 2

## L-1uH-8.8A
designator L?  Inductance: 1uH  Current Rating (Amps): 12A
FIXED IND 1UH 12A 9 MOHM SMD; Manufacturer Part Number: XGL4020-102MEC; Manufacturer: COILCRAFT; Tolerance: ±20%; Isat: 8.8A; Shielding: Shielded; DCR: 9mOhm; Frequency - Self Resonant: 60MHz; Inductance Frequency - Test: 1MHz; Object Type: Part; Design Item ID: L-1uH-8.8A; Series: XGL4020; Material - Core: -; Q @ Freq: -; Ratings: AEC-Q200; Operating Temperature: -40°C~125°C; Features: -; Mounting Type: SurfaceMount; Size: 4.00mmx4.00mm; Height: 2.10mm; Category: Inductor
footprint XGL4020
pins: 1, 2

## L-1uH-10.3A
designator L?  Inductance: 1uH  Current Rating (Amps): 13A
FIXED IND 1UH 13A 7.2 MOHM SMD; Manufacturer Part Number: XGL4030-102MEC; Manufacturer: COILCRAFT; Tolerance: ±20%; Isat: 10.3A; Shielding: Shielded; Frequency - Self Resonant: 65MHz; Inductance Frequency - Test: 1MHz; Object Type: Part; Design Item ID: L-1uH-10.3A; Series: XGL4030; Material - Core: -; DCR: 7.2mOhm; Q @ Freq: -; Ratings: AEC-Q200; Operating Temperature: -40°C~125°C; Features: -; Mounting Type: SurfaceMount; Size: 4.00mmx4.00mm; Height: 3.10mm; Category: Inductor
footprint XGL4030
pins: 1, 2

## L-2.2uH-1.35A
designator L?  Inductance: 2.2uH  Current Rating (Amps): 1.3A
FIXED IND 2.2UH 1.3A 173MOHM SMD; Manufacturer Part Number: XPL2010-222MLC; Manufacturer: COILCRAFT; Tolerance: ±20%; Isat: 1.35A; Shielding: Shielded; Frequency - Self Resonant: 75MHz; Inductance Frequency - Test: 1MHz; Object Type: Part; Design Item ID: L-2.2uH-1.35A; Series: XPL2010; Material - Core: -; DCR: 173mOhm; Q @ Freq: -; Ratings: AEC-Q200; Operating Temperature: -40°C~125°C; Features: -; Mounting Type: SurfaceMount; Size: 2.00mmx1.90mm; Height: 1.00mm; Category: Inductor
footprint XPL2010
pins: 1, 2

## L-2.2uH-2.1A
designator L?  Inductance: 2.2uH  Current Rating (Amps): 1.4A
FIXED IND 2.2UH 1.4A 110MOHM SMD; Manufacturer Part Number: LPS3015-222MRC; Manufacturer: COILCRAFT; Material - Core: Ferrite; Tolerance: ±20%; Isat: 2.1A; Shielding: Shielded; Frequency - Self Resonant: 110MHz; Inductance Frequency - Test: 100kHz; Object Type: Part; Design Item ID: L-2.2uH-2.1A; Series: LPS3015; DCR: 110mOhm; Q @ Freq: -; Ratings: AEC-Q200; Operating Temperature: -40°C~125°C; Features: -; Mounting Type: SurfaceMount; Size: 2.95mmx2.95mm; Height: 1.50mm; Category: Inductor
footprint LPS3015
pins: 1, 2

## L-2.2uH-2.9A
designator L?  Inductance: 2.2uH  Current Rating (Amps): 2A
FIXED IND 2.2UH 2A 70 MOHM SMD; Manufacturer Part Number: LPS4018-222MRC; Manufacturer: COILCRAFT; Material - Core: Ferrite; Tolerance: ±20%; Isat: 2.9A; Shielding: Shielded; DCR: 70mOhm; Frequency - Self Resonant: 90MHz; Inductance Frequency - Test: 100kHz; Object Type: Part; Design Item ID: L-2.2uH-2.9A; Series: LPS4018; Q @ Freq: -; Ratings: AEC-Q200; Operating Temperature: -40°C~125°C; Features: -; Mounting Type: SurfaceMount; Size: 3.90mmx3.90mm; Height: 1.80mm; Category: Inductor
footprint LPS4018
pins: 1, 2

## L-2.2uH-6.2A
designator L?  Inductance: 2.2uH  Current Rating (Amps): 8.9A
FIXED IND 2.2UH 8.9A 21.5MOHM SM; Manufacturer Part Number: XGL4020-222MEC; Manufacturer: COILCRAFT; Tolerance: ±20%; Isat: 6.2A; Shielding: Shielded; Frequency - Self Resonant: 40MHz; Inductance Frequency - Test: 1MHz; Object Type: Part; Design Item ID: L-2.2uH-6.2A; Series: XGL4020; Material - Core: -; DCR: 21.5mOhm; Q @ Freq: -; Ratings: AEC-Q200; Operating Temperature: -40°C~125°C; Features: -; Mounting Type: SurfaceMount; Size: 4.00mmx4.00mm; Height: 2.10mm; Category: Inductor
footprint XGL4020
pins: 1, 2

## L-2.2uH-7A
designator L?  Inductance: 2.2uH  Current Rating (Amps): 8.7A